# Altium footprint library Wurth_Elektronik_Electromechanic_Wire_to_Board_Connectors_rev16a.PCBLIB: 662 footprints (part 20 of 42)
Each footprint in its own frame and in the unit in brackets; x right, y up, seen from the top. Pads: shape width x height; smd on the part's side, far side on the other; paste and mask are expansions set on the pad; w line width, h text height; cw(c..) or ccw(c..) is an arc to the next point about the centre after c.
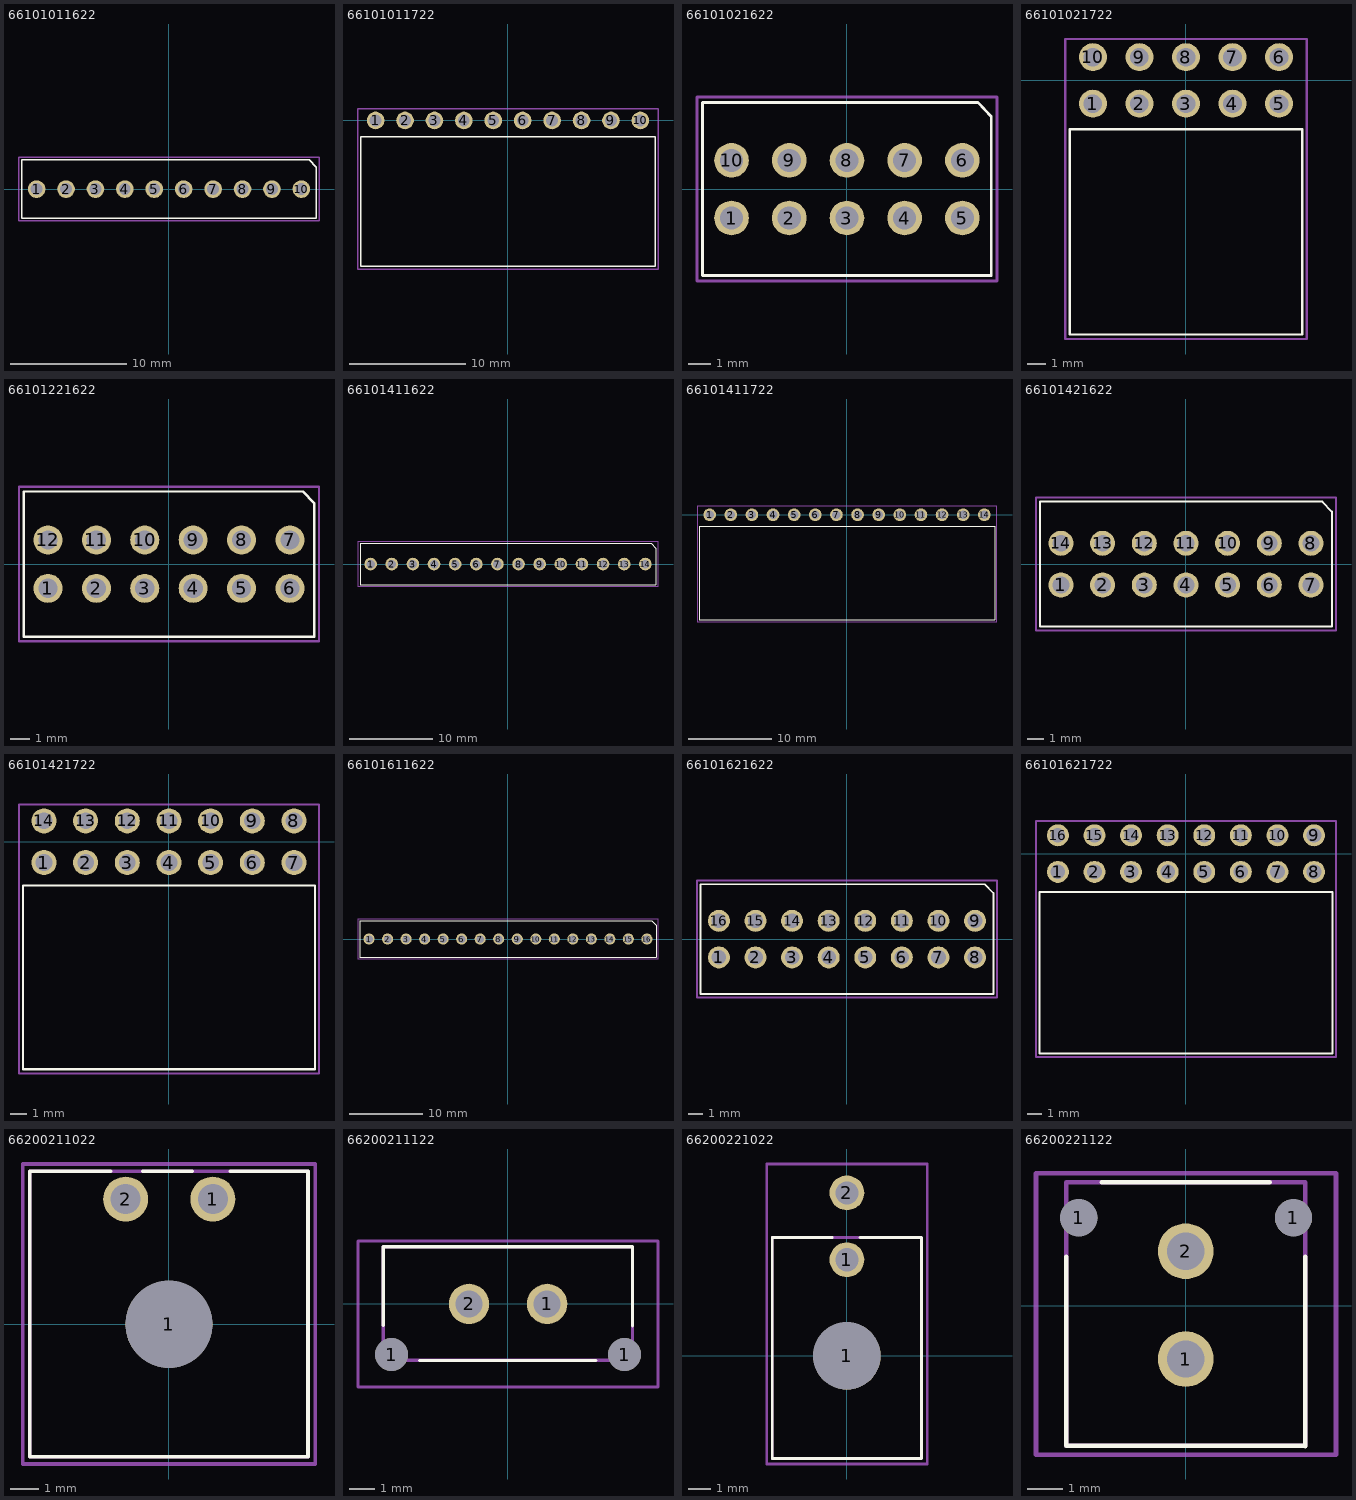
[diagram p19: the footprints below, top view; thin cyan lines are the x and y axes]

## 66101011622 [mil]
pads (10):
  round 60 hole 40: 1(-450,0) 2(-350,0) 3(-250,0) 4(-150,0) 5(-50,0) 6(50,0) 7(150,0) 8(250,0) 9(350,0) 10(450,0)
Top Overlay:
  lines w5: -500,-98.43 500,-98.43 500,75 477,99 -500,99 -500,-98.43
Mechanical 2:
  text ">Name" at -149.61,130 h77.5
Mechanical 4:
  text ">Value" at -145.67,-169.29 h77.5
Mechanical 27:
  lines w5: -509.84,-108.27 510,-108.27 510,109 -509.84,109 -509.84,-108.27

## 66101011722 [mil]
pads (10):
  round 60 hole 40: 1(-450,0) 2(-350,0) 3(-250,0) 4(-150,0) 5(-50,0) 6(50,0) 7(150,0) 8(250,0) 9(350,0) 10(450,0)
Top Overlay:
  lines w5: -500,-496.06 500,-496.06 500,-55.12 -500,-55.12 -500,-496.06
Mechanical 2:
  text ">Name" at -107.87,65 h77.5
Mechanical 4:
  text ">Value" at -100,-576.38 h77.5
Mechanical 27:
  lines w5: -509.84,-505.91 -509.84,40 510,40 510,-505.91 -509.84,-505.91

## 66101021622 [mil]
pads (10):
  round 60 hole 40: 1(-200,-50) 2(-100,-50) 3(0,-50) 4(100,-50) 5(200,-50) 6(200,50) 7(100,50) 8(0,50) 9(-100,50) 10(-200,50)
Top Overlay:
  lines w5: -250,-149.61 250,-149.61 250,126 227,150 -250,150 -250,-149.61
Mechanical 2:
  text ">Name" at -112.2,191 h77.5
Mechanical 4:
  text ">Value" at -111.42,-226.38 h77.5
Mechanical 27:
  lines w5: -259.84,-159.45 260,-159.45 260,160 -259.84,160 -259.84,-159.45

## 66101021722 [mil]
pads (10):
  round 60 hole 40: 1(-200,-50) 2(-100,-50) 3(0,-50) 4(100,-50) 5(200,-50) 6(200,50) 7(100,50) 8(0,50) 9(-100,50) 10(-200,50)
Top Overlay:
  lines w5: -250,-546.06 250,-546.06 250,-105.12 -250,-105.12 -250,-546.06
Mechanical 2:
  text ">Name" at -109.06,111 h77.5
Mechanical 4:
  text ">Value" at -107.87,-626.38 h77.5
Mechanical 27:
  lines w5: -259.84,-555.91 -259.84,89 260,89 260,-555.91 -259.84,-555.91

## 66101221622 [mil]
pads (12):
  round 60 hole 40: 1(-250,-50) 2(-150,-50) 3(-50,-50) 4(50,-50) 5(150,-50) 6(250,-50) 7(250,50) 8(150,50) 9(50,50) 10(-50,50) 11(-150,50) 12(-250,50)
Top Overlay:
  lines w5: -300,-149.61 300,-149.61 300,126 277,150 -300,150 -300,-149.61
Mechanical 2:
  text ">Name" at -96.46,179 h77.5
Mechanical 4:
  text ">Value" at -131.1,-226.38 h77.5
Mechanical 27:
  lines w5: -309.84,-159.45 310,-159.45 310,160 -309.84,160 -309.84,-159.45

## 66101411622 [mil]
pads (14):
  round 60 hole 40: 1(-650,0) 2(-550,0) 3(-450,0) 4(-350,0) 5(-250,0) 6(-150,0) 7(-50,0) 8(50,0) 9(150,0) 10(250,0) 11(350,0) 12(450,0) 13(550,0) 14(650,0)
Top Overlay:
  lines w5: -700,-98.43 700,-98.43 700,75 677,99 -700,99 -700,-98.43
Mechanical 2:
  text ">Name" at -149.61,130 h77.5
Mechanical 4:
  text ">Value" at -145.67,-169.29 h77.5
Mechanical 27:
  lines w5: -709.84,-108.27 710,-108.27 710,109 -709.84,109 -709.84,-108.27

## 66101411722 [mil]
pads (14):
  round 60 hole 40: 1(-650,0) 2(-550,0) 3(-450,0) 4(-350,0) 5(-250,0) 6(-150,0) 7(-50,0) 8(50,0) 9(150,0) 10(250,0) 11(350,0) 12(450,0) 13(550,0) 14(650,0)
Top Overlay:
  lines w5: -700,-496.06 700,-496.06 700,-55.12 -700,-55.12 -700,-496.06
Mechanical 2:
  text ">Name" at -103.94,65 h77.5
Mechanical 4:
  text ">Value" at -96.06,-576.38 h77.5
Mechanical 27:
  lines w5: -709.84,-505.91 -709.84,40 710,40 710,-505.91 -709.84,-505.91

## 66101421622 [mil]
pads (14):
  round 60 hole 40: 1(-300,-50) 2(-200,-50) 3(-100,-50) 4(0,-50) 5(100,-50) 6(200,-50) 7(300,-50) 8(300,50) 9(200,50) 10(100,50) 11(0,50) 12(-100,50) 13(-200,50) 14(-300,50)
Top Overlay:
  lines w5: -350,-149.61 350,-149.61 350,126 327,150 -350,150 -350,-149.61
Mechanical 2:
  text ">Name" at -124.41,179 h77.5
Mechanical 4:
  text ">Value" at -123.62,-222.44 h77.5
Mechanical 27:
  lines w5: -359.84,-159.45 360,-159.45 360,160 -359.84,160 -359.84,-159.45

## 66101421722 [mil]
pads (14):
  round 60 hole 40: 1(-300,-50) 2(-200,-50) 3(-100,-50) 4(0,-50) 5(100,-50) 6(200,-50) 7(300,-50) 8(300,50) 9(200,50) 10(100,50) 11(0,50) 12(-100,50) 13(-200,50) 14(-300,50)
Top Overlay:
  lines w5: -350,-546.06 350,-546.06 350,-105.12 -350,-105.12 -350,-546.06
Mechanical 2:
  text ">Name" at -24.8,115 h77.5
Mechanical 4:
  text ">Value" at -23.62,-618.5 h77.5
Mechanical 27:
  lines w5: -359.84,-555.91 -359.84,89 360,89 360,-555.91 -359.84,-555.91

## 66101611622 [mil]
pads (16):
  round 60 hole 40: 1(-750,0) 2(-650,0) 3(-550,0) 4(-450,0) 5(-350,0) 6(-250,0) 7(-150,0) 8(-50,0) 9(50,0) 10(150,0) 11(250,0) 12(350,0) 13(450,0) 14(550,0) 15(650,0) 16(750,0)
Top Overlay:
  lines w5: -800,-98.43 800,-98.43 800,75 777,99 -800,99 -800,-98.43
Mechanical 2:
  text ">Name" at -149.61,130 h77.5
Mechanical 4:
  text ">Value" at -145.67,-169.29 h77.5
Mechanical 27:
  lines w5: -809.84,-108.27 810,-108.27 810,109 -809.84,109 -809.84,-108.27

## 66101621622 [mil]
pads (16):
  round 60 hole 40: 1(-350,-50) 2(-250,-50) 3(-150,-50) 4(-50,-50) 5(50,-50) 6(150,-50) 7(250,-50) 8(350,-50) 9(350,50) 10(250,50) 11(150,50) 12(50,50) 13(-50,50) 14(-150,50) 15(-250,50) 16(-350,50)
Top Overlay:
  lines w5: -400,-149.61 400,-149.61 400,126 377,150 -400,150 -400,-149.61
Mechanical 2:
  text ">Name" at -112.2,191 h77.5
Mechanical 4:
  text ">Value" at -81.1,-214.57 h77.5
Mechanical 27:
  lines w5: -409.84,-159.45 410,-159.45 410,160 -409.84,160 -409.84,-159.45

## 66101621722 [mil]
pads (16):
  round 60 hole 40: 1(-350,-50) 2(-250,-50) 3(-150,-50) 4(-50,-50) 5(50,-50) 6(150,-50) 7(250,-50) 8(350,-50) 9(350,50) 10(250,50) 11(150,50) 12(50,50) 13(-50,50) 14(-150,50) 15(-250,50) 16(-350,50)
Top Overlay:
  lines w5: -400,-546.06 400,-546.06 400,-105.12 -400,-105.12 -400,-546.06
Mechanical 2:
  text ">Name" at -78.74,127 h77.5
Mechanical 4:
  text ">Value" at -53.94,-622.44 h77.5
Mechanical 27:
  lines w5: -409.84,-555.91 -409.84,89 410,89 410,-555.91 -409.84,-555.91

## 66200211022 [mil]
pads (3):
  round 119 hole 119: 1(0,0)
  round 61.5 hole 41: 1(60,171) 2(-59.06,171)
Top Overlay:
  lines w5: -79.92,209 -189.96,209 -189.96,-181.1 190,-181.1 190,209 84,209 ; -35.43,209 32,209
Mechanical 2:
  text ">NAME" at 250,21 h77.5
Mechanical 4:
  text ">VALUE" at 250,-54.92 h77.5
Mechanical 16:
  lines w5: -189.96,-181.1 190,-181.1 190,209 -189.96,209 -189.96,-181.1
  text "1" at 50,146 h77.5
  text "2" at -75,146 h77.5
Mechanical 27:
  lines w5: -199.8,-190.94 200,-190.94 200,219 -199.8,219 -199.8,-190.94

## 66200211122 [mil]
pads (4):
  round 50 hole 50: 1(-177.17,-77.17) 1(178,-77.17)
  round 61.5 hole 41: 1(60,0) 2(-59.06,0)
Top Overlay:
  lines w5: -189.96,-32.48 -189.96,87 190,87 190,-33.27 ; -134.65,-86.22 134,-86.22
Mechanical 2:
  text ">NAME" at 256,16 h77.5
Mechanical 4:
  text ">VALUE" at 249,-66.93 h77.5
Mechanical 16:
  lines w5: -189.96,-86.02 190,-86.02 190,87 -189.96,87 -189.96,-86.02
  text "1" at 40,-19.68 h77.5
  text "2" at -78.74,-23.62 h77.5
Mechanical 27:
  lines w5: -228.35,-126.77 229,-126.77 229,96 -228.35,96 -228.35,-126.77

## 66200221022 [mil]
pads (3):
  round 119 hole 119: 1(0,0)
  round 61.5 hole 41: 1(0,170) 2(0,288)
Top Overlay:
  lines w5: -25.98,209 -131.89,209 -131.89,-181.1 132,-181.1 132,209 23,209
Mechanical 2:
  text ">NAME" at 200,104 h77.5
Mechanical 4:
  text ">VALUE" at 200,29 h77.5
Mechanical 16:
  lines w5: -131.89,-181.1 132,-181.1 132,209 -131.89,209 -131.89,-181.1
  text "1" at -25,154 h77.5
  text "2" at -25,254 h77.5
Mechanical 27:
  lines w5: -141.73,-190.94 142,-190.94 142,339 -141.73,339 -141.73,-190.94

## 66200221122 [mil]
pads (4):
  round 41 hole 41: 1(-118.11,97) 1(119,97)
  round 61.5 hole 41: 1(0,-59.06) 2(0,60)
Top Overlay:
  lines w5: -131.89,54 -131.89,-154.72 132,-154.72 ; -92.52,136 93,136 ; 132,-155.12 132,54
Mechanical 2:
  text ">NAME" at -485.63,25 h77.5
Mechanical 4:
  text ">VALUE" at -491.34,-66.14 h77.5
Mechanical 16:
  lines w5: -131.89,-154.72 -131.89,136 132,136 132,-154.72 -131.89,-154.72
  text "1" at -25,-75 h77.5
Mechanical 27:
  lines w5: -165.35,-164.57 166,-164.57 166,146 -165.35,146 -165.35,-164.57